# Altium footprint library PcbLib1.PcbLib: 38 footprints (part 1 of 3)
Each footprint in its own frame and in the unit in brackets; x right, y up, seen from the top. Pads: shape width x height; smd on the part's side, far side on the other; paste and mask are expansions set on the pad; w line width, h text height; cw(c..) or ccw(c..) is an arc to the next point about the centre after c.
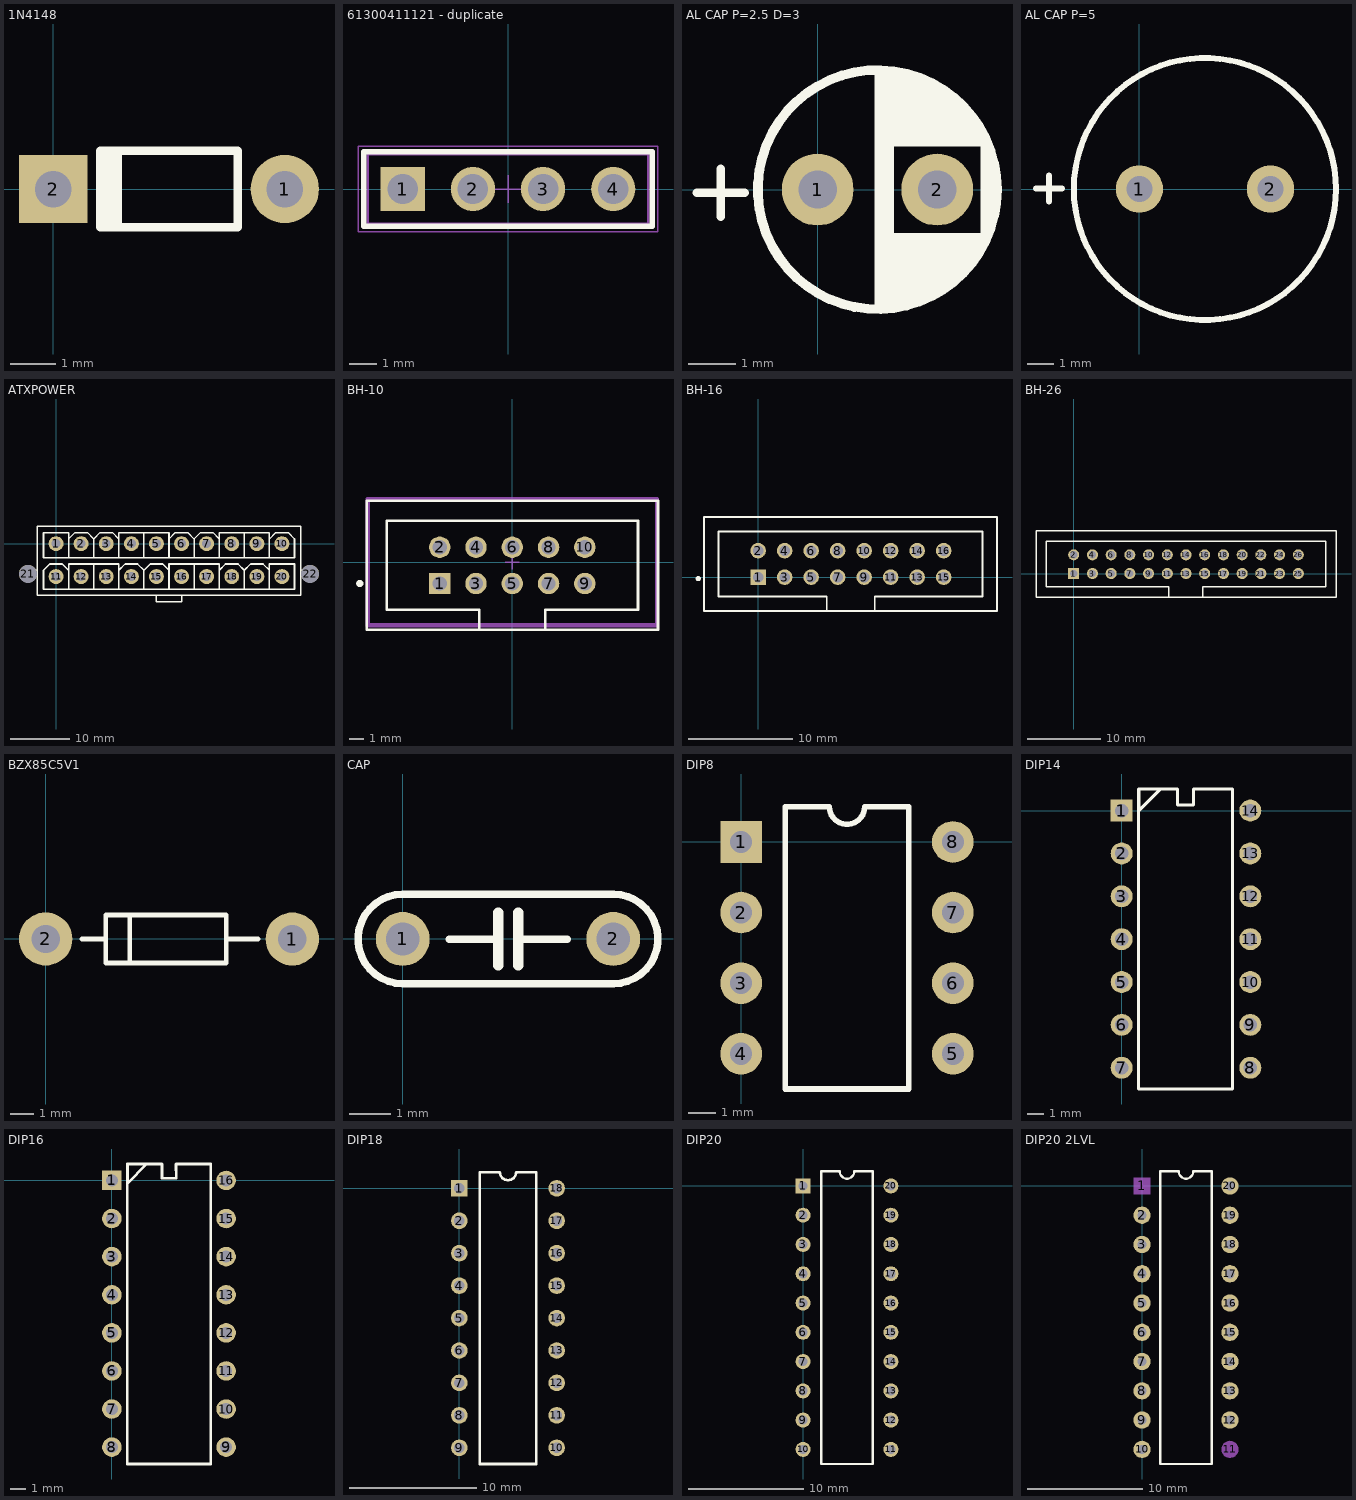
[diagram p0: the footprints below, top view; thin cyan lines are the x and y axes]

## 1N4148 [mm]
pads (2):
  round 1.5 hole 0.8: 1(5.08,0)
  rect 1.5x1.5 hole 0.8: 2(0,0)
Top Overlay:
  rectangle: 1.032,-0.794 1.42,0.786
  lines w0.178: 1.03,-0.794 1.42,-0.794 1.42,0.786 1.03,0.786 1.03,-0.794 ; 1.032,-0.838 1.032,0.839 4.048,0.839 4.048,-0.838 1.032,-0.838
  text ".Comment" at 1.661,-0.492 h1
3D body "User Library-1N4148.step": height 1.82, standoff -1, extent -0.289,-0.839 5.222,0.811

## 61300411121 - duplicate [mm] "Pin Header, pitch 2.54 mm, THT, Vertical, single row, 4p"
height 8.54
pads (4):
  rect 1.6x1.6 hole 1.1: 1(-3.81,0)
  round 1.6 hole 1.1: 2(-1.27,0) 3(1.27,0) 4(3.81,0)
Top Overlay:
  lines w0.2: -5.23,-1.345 5.23,-1.345 5.23,1.345 -5.23,1.345 -5.23,-1.345
Mechanical 13:
  lines w0.1: -5.08,-1.27 -5.08,1.27 5.08,1.27 5.08,-1.27 -5.08,-1.27
Mechanical 15:
  lines w0.05: -0.5,0 0.5,0 ; 0,-0.5 0,0.5 ; -5.43,-1.545 -5.43,1.545 5.43,1.545 5.43,-1.545 -5.43,-1.545
3D body "61300411121.stp": height 8.57, standoff -2.97, extent -5.08,-1.27 5.08,1.27

## AL CAP P=2.5 D=3 [mm]
pads (2):
  round 1.5 hole 0.8: 1(0,0) 2(2.5,0)
Top Overlay:
  circle w0.2: c1.25,0 r2.5
  region: 1.935,2.455 2.397,2.264 2.813,1.986 3.167,1.632 3.445,1.216 3.636,0.754 3.734,0.263 3.734,-0.237 3.636,-0.728 3.445,-1.19 3.167,-1.606 2.813,-1.96 2.397,-2.238 1.935,-2.43 1.444,-2.527 1.194,-2.527 1.194,2.553 1.444,2.553 hole: 3.4,0.9 1.6,0.9 1.6,-0.9 3.4,-0.9
  lines w0.178: -2.522,-0.069 -1.522,-0.069 ; -2.022,-0.569 -2.022,0.431
3D body "User Library-CAPAER_D050_L110_P025_W005X030.STEP": height 11.31, standoff -2.7, extent -1.276,-2.517 3.734,2.483

## AL CAP P=5 [mm]
pads (2):
  round 1.8 hole 1: 1(0,0) 2(5,0)
Top Overlay:
  lines w0.229: -3.942,0.017 -2.942,0.017 ; -3.442,-0.483 -3.442,0.517 ; -2.5,0 ccw(c2.5,0) 7.5,0 ccw(c2.5,0) -2.5,0
3D body "User Library-CAPAER_D125_L170_P050_W006X030.STEP": height 17.02, standoff -3, extent -3.71,-6.25 8.8,6.25

## ATXPOWER [mm]
pads (22):
  round 2.5 hole 1.5: 1(0,0) 2(4.2,0) 3(8.4,0) 4(12.6,0) 5(16.8,0) 6(21,0) 7(25.2,0) 8(29.4,0) 9(33.6,0) 10(37.8,0) 11(0,-5.5) 12(4.2,-5.5) 13(8.4,-5.5) 14(12.6,-5.5) 15(16.8,-5.5) 16(21,-5.5) 17(25.2,-5.5) 18(29.4,-5.5) 19(33.6,-5.5) 20(37.8,-5.5)
  round 3 hole 3 unplated: 21(-4.7,-5.04) 22(42.5,-5.04)
Top Overlay:
  lines w0.254: -3.65,-4.376 ccw(c-4.6,-4.97) -3.598,-5.472 ; -3.556,-5.334 -3.175,-5.334 ; -3.556,-4.445 -3.175,-4.445 ; 2.1,0.8 3.15,1.85 5.25,1.85 6.3,0.8 ; 10.5,-4.45 11.55,-3.4 13.65,-3.4 14.7,-4.45 ; 16.8,-8.65 16.8,-9.7 21,-9.7 21,-8.65 ; 41.021,-5.334 41.402,-5.334 ; 41.021,-4.445 41.402,-4.445 ; 41.444,-5.472 ccw(c42.446,-4.97) 41.496,-4.376 ; 2.1,-7.6 2.1,-4.45 ; 2.1,-7.6 -2.1,-7.6 -2.1,-4.45 -1.05,-3.4 1.05,-3.4 2.1,-4.45 ; 2.1,-7.6 6.3,-7.6 ; 2.1,-4.45 2.1,-3.4 6.3,-3.4 ; 2.1,-2.35 -2.1,-2.35 -2.1,1.85 2.1,1.85 2.1,-2.35 ; 2.1,-2.35 6.3,-2.35 ; 6.3,-7.6 6.3,-3.4 ; 6.3,-7.6 10.5,-7.6 ; 6.3,-3.4 10.5,-3.4 10.5,-7.6 ; 6.3,-2.35 6.3,0.8 ; 6.3,-2.35 10.5,-2.35 ; 6.3,0.8 7.35,1.85 9.45,1.85 10.5,0.8 ; 10.5,-7.6 14.7,-7.6 ; 10.5,-2.35 14.7,-2.35 ; 10.5,-2.35 10.5,0.8 ; 10.5,0.8 10.5,1.85 14.7,1.85 ; 14.7,-7.6 14.7,-4.45 ; 14.7,-7.6 18.9,-7.6 ; 14.7,-4.45 15.75,-3.4 17.85,-3.4 18.9,-4.45 ; 14.7,-2.35 14.7,1.85 ; 14.7,-2.35 18.9,-2.35 ; 14.7,1.85 18.9,1.85 18.9,-2.35 ; 18.9,-7.6 18.9,-4.45 ; 18.9,-7.6 23.1,-7.6 ; 18.9,-4.45 18.9,-3.4 23.1,-3.4 ; 18.9,-2.35 23.1,-2.35 ; 18.9,-2.35 18.9,0.8 19.95,1.85 22.05,1.85 23.1,0.8 ; 23.1,-7.6 23.1,-3.4 ; 23.1,-7.6 27.3,-7.6 ; 23.1,-3.4 27.3,-3.4 27.3,-7.6 ; 23.1,-2.35 23.1,0.8 ; 23.1,-2.35 23.1,0.8 ; 23.1,-2.35 27.3,-2.35 ; 23.1,0.8 24.15,1.85 26.25,1.85 27.3,0.8 ; 27.3,-7.6 27.3,-4.45 28.35,-3.4 30.45,-3.4 31.5,-4.45 ; 27.3,-7.6 31.5,-7.6 ; 27.3,-2.35 31.5,-2.35 ; 27.3,-2.35 27.3,0.8 ; 27.3,0.8 27.3,1.85 31.5,1.85 ; 31.5,-7.6 31.5,-4.45 ; 31.5,-7.6 35.7,-7.6 ; 31.5,-4.45 32.55,-3.4 34.65,-3.4 35.7,-4.45 35.7,-7.6 ; 31.5,-2.35 31.5,1.85 ; 31.5,-2.35 35.7,-2.35 ; 31.5,1.85 35.7,1.85 35.7,-2.35 ; 35.7,-7.6 35.7,-3.4 39.9,-3.4 39.9,-7.6 35.7,-7.6 ; 35.7,-2.35 39.9,-2.35 39.9,0.8 38.85,1.85 36.75,1.85 35.7,0.8 35.7,-2.35 ; -3.15,-8.65 -3.15,2.9 40.95,2.9 40.95,-8.65 -3.15,-8.65
3D body "c-2-1775099-7-e-3d.stp": height 13.3, standoff -2.7, extent -5.7,-8.8 43.5,2.1

## BH-10 [mm]
pads (10):
  rect 1.5x1.5 hole 1 paste-1000 mask+0: 1(-5.08,-1.495)
  round 1.5 hole 1 paste-1000 mask+0: 2(-5.08,1.045) 3(-2.54,-1.495) 4(-2.54,1.045) 5(0,-1.495) 6(0,1.045) 7(2.54,-1.495) 8(2.54,1.045) 9(5.08,-1.495) 10(5.08,1.045)
Top Overlay:
  circle w0.25: c-10.675,-1.495 r0.125
  lines w0.178: -10.2,-4.715 10.2,-4.715 10.2,4.285 -10.2,4.285 -10.2,-4.715 ; -8.8,-3.315 -8.8,2.885 8.8,2.885 8.8,-3.315 2.3,-3.315 2.3,-4.715 -2.3,-4.715 -2.3,-3.315 -8.8,-3.315
Top 3D Body:
  lines w0.2: -10.075,4.36 -10.075,-4.36 10.075,-4.36 10.075,4.36
Top Courtyard:
  lines w0.2: -10.175,-4.46 10.175,-4.46 10.175,4.46 -10.175,4.46 -10.175,-4.46
Top Assembly:
  lines w0.2: -10.175,-4.46 10.175,-4.46 10.175,4.46 -10.175,4.46 -10.175,-4.46
  text ".Designator" at 0,0.187 h1
Top Component Center:
  lines w0.1: -0.5,0 0.5,0 ; 0,-0.5 0,0.5
3D body "Conn_3M_D2510-6002-AR_eec.STEP": height 10.14, standoff -2.74, extent -10.008,-4.343 10.008,4.244

## BH-16 [mm]
pads (16):
  rect 1.5x1.5 hole 1 paste-1000 mask+0: 1(0,0)
  round 1.5 hole 1 paste-1000 mask+0: 2(0,2.54) 3(2.54,0) 4(2.54,2.54) 5(5.08,0) 6(5.08,2.54) 7(7.62,0) 8(7.62,2.54) 9(10.16,0) 10(10.16,2.54) 11(12.7,0) 12(12.7,2.54) 13(15.24,0) 14(15.24,2.54) 15(17.78,0) 16(17.78,2.54)
Top Overlay:
  circle w0.25: c-5.732,-0.142 r0.121
  lines w0.178: -5.181,-3.242 22.889,-3.242 22.889,5.758 -5.181,5.758 -5.181,-3.242 ; -3.781,-1.842 -3.781,4.358 21.489,4.358 21.489,-1.842 11.179,-1.842 11.179,-3.242 6.579,-3.242 6.579,-1.842 -3.781,-1.842
3D body "61201621621.stp": height 9.43, standoff -2.68, extent -5.1,-3.155 22.88,6.018

## BH-26 [mm]
pads (26):
  rect 1.5x1.5 hole 1 paste-1000 mask+0: 1(0,0)
  round 1.5 hole 1 paste-1000 mask+0: 2(0,2.54) 3(2.54,0) 4(2.54,2.54) 5(5.08,0) 6(5.08,2.54) 7(7.62,0) 8(7.62,2.54) 9(10.16,0) 10(10.16,2.54) 11(12.7,0) 12(12.7,2.54) 13(15.24,0) 14(15.24,2.54) 15(17.78,0) 16(17.78,2.54) 17(20.32,0) 18(20.32,2.54) 19(22.86,0) 20(22.86,2.54) 21(25.4,0) 22(25.4,2.54) 23(27.94,0) 24(27.94,2.54) 25(30.48,0) 26(30.48,2.54)
Top Overlay:
  lines w0.178: 34.2,-1.81 17.54,-1.81 17.54,-3.21 12.92,-3.21 12.92,-1.82 -3.71,-1.82 -3.72,-1.81 -3.72,4.39 34.2,4.39 34.2,-1.79 34.21,-1.8 ; -5.12,-3.21 -5.12,5.79 35.6,5.79 35.6,-3.21 -5.12,-3.21
3D body "70285264.stp": height 9, standoff -3.15, extent -5.035,-3.1 35.635,5.898

## BZX85C5V1 [mm]
pads (2):
  round 2.25 hole 1.2: 1(10.415,-0.003) 2(0,0)
Top Overlay:
  lines w0.2: 1.524,0 2.54,0 ; 3.556,-1.016 3.556,1.016 ; 7.62,0 8.964,0 ; 2.54,-1.016 2.54,1.016 7.62,1.016 7.62,-1.016 2.54,-1.016
3D body "BZX85C5V1 A0G.STEP": height 3.35, standoff -3.22, extent -0.5,-1.186 10.887,1.174

## CAP [mm]
pads (2):
  round 1.3 hole 0.8: 1(0,0) 2(5.08,0)
Top Overlay:
  lines w0.178: -0.003,-1.083 5.097,-1.083 ; 0,-1.08 cw(c0,0) 0,1.08 ; 0.017,1.076 5.097,1.076 ; 1.118,-0.003 2.229,-0.003 ; 2.864,-0.003 3.975,-0.003 ; 5.08,-1.08 ccw(c5.08,0) 5.08,1.08
  lines w0.25: 2.309,-0.638 2.309,0.632 ; 2.785,-0.638 2.785,0.632
3D body "User Library-0,22uF Capacitor 5,08 mm.step": height 6, standoff -2.39, extent -0.25,-1.1 5.33,1.11

## DIP8 [mm]
pads (8):
  rect 1.5x1.5 hole 0.8: 1(0,0)
  round 1.5 hole 0.8: 2(0,-2.54) 3(0,-5.08) 4(0,-7.62) 5(7.62,-7.62) 6(7.62,-5.08) 7(7.62,-2.54) 8(7.62,0)
Top Overlay:
  lines w0.2: 1.585,-8.89 6.035,-8.89 6.035,1.27 4.445,1.27 cw(c3.81,1.27) 3.175,1.27 1.585,1.27 1.585,-8.89
3D body "DIP-8-1.step": height 4.36, standoff -3, extent -0.125,-8.51 7.745,0.89

## DIP14 [mm]
pads (14):
  rect 1.3x1.3 hole 0.8: 1(0,0)
  round 1.3 hole 0.8: 2(0,-2.54) 3(0,-5.08) 4(0,-7.62) 5(0,-10.16) 6(0,-12.7) 7(0,-15.24) 8(7.62,-15.24) 9(7.62,-12.7) 10(7.62,-10.16) 11(7.62,-7.62) 12(7.62,-5.08) 13(7.62,-2.54) 14(7.62,0)
Top Overlay:
  lines w0.178: 1.007,-16.501 1.007,1.279 3.318,1.279 3.318,0.329 4.258,0.329 4.258,1.279 6.568,1.279 6.568,-16.501 1.007,-16.501 ; 1.016,-0.01 2.286,1.27 1.016,1.27 1.016,-0.01
3D body "User Library-integrated circuit DIP14.STEP": height 4.19, standoff -2.97, extent 0.031,-17.247 7.651,2.053

## DIP16 [mm]
pads (16):
  rect 1.3x1.3 hole 0.8: 1(0,0)
  round 1.3 hole 0.8: 2(0,-2.54) 3(0,-5.08) 4(0,-7.62) 5(0,-10.16) 6(0,-12.7) 7(0,-15.24) 8(0,-17.78) 9(7.62,-17.78) 10(7.62,-15.24) 11(7.62,-12.7) 12(7.62,-10.16) 13(7.62,-7.62) 14(7.62,-5.08) 15(7.62,-2.54) 16(7.62,0)
Top Overlay:
  lines w0.178: 2.463,-18.903 6.595,-18.903 6.595,1.097 4.282,1.097 4.282,0.147 3.342,0.147 3.342,1.097 1.029,1.097 1.029,-18.903 3.177,-18.903 ; 1.041,-0.189 2.311,1.091 1.041,1.091 1.041,-0.189
3D body "User Library-DIP16-22mm.STEP": height 5.15, standoff -2.49, extent -0.125,-19.89 7.745,2.11

## DIP18 [mm]
pads (18):
  rect 1.3x1.3 hole 0.8: 1(0,0)
  round 1.3 hole 0.8: 2(0,-2.54) 3(0,-5.08) 4(0,-7.62) 5(0,-10.16) 6(0,-12.7) 7(0,-15.24) 8(0,-17.78) 9(0,-20.32) 10(7.62,-20.32) 11(7.62,-17.78) 12(7.62,-15.24) 13(7.62,-12.7) 14(7.62,-10.16) 15(7.62,-7.62) 16(7.62,-5.08) 17(7.62,-2.54) 18(7.62,0)
Top Overlay:
  lines w0.2: 1.585,-21.59 6.035,-21.59 6.035,1.27 4.445,1.27 cw(c3.81,1.27) 3.175,1.27 1.585,1.27 1.585,-21.59
3D body "User Library-DIP18.step": height 3.47, standoff -2.87, extent -1.5,-21.635 9,1.234

## DIP20 [mm]
pads (20):
  rect 1.3x1.3 hole 0.8: 1(0,0)
  round 1.3 hole 0.8: 2(0,-2.54) 3(0,-5.08) 4(0,-7.62) 5(0,-10.16) 6(0,-12.7) 7(0,-15.24) 8(0,-17.78) 9(0,-20.32) 10(0,-22.86) 11(7.62,-22.86) 12(7.62,-20.32) 13(7.62,-17.78) 14(7.62,-15.24) 15(7.62,-12.7) 16(7.62,-10.16) 17(7.62,-7.62) 18(7.62,-5.08) 19(7.62,-2.54) 20(7.62,0)
Top Overlay:
  lines w0.2: 1.585,-24.13 1.585,1.27 3.175,1.27 ccw(c3.81,1.27) 4.445,1.27 6.035,1.27 6.035,-24.13 1.585,-24.13
3D body "User Library-DIP-20P-M01.step": height 4.36, standoff -3, extent -0.125,-23.73 7.745,0.87

## DIP20 2LVL [mm]
pads (20):
  rect 1.5x1.5 on Mech5: 1(0,0)
  round 1.5 hole 0.8: 2(0,-2.54) 3(0,-5.08) 4(0,-7.62) 5(0,-10.16) 6(0,-12.7) 7(0,-15.24) 8(0,-17.78) 9(0,-20.32) 10(0,-22.86) 12(7.62,-20.32) 13(7.62,-17.78) 14(7.62,-15.24) 15(7.62,-12.7) 16(7.62,-10.16) 17(7.62,-7.62) 18(7.62,-5.08) 19(7.62,-2.54) 20(7.62,0)
  round 1.5 on Mech5: 11(7.62,-22.86)
Top Overlay:
  lines w0.2: 1.585,-24.13 1.585,1.27 3.175,1.27 ccw(c3.81,1.27) 4.445,1.27 6.035,1.27 6.035,-24.13 1.585,-24.13
3D body "User Library-DIP-20P-M01.step": height 9.36, standoff 2, extent -0.125,-23.73 7.745,0.87